# Altium footprint library CAP_TH.PcbLib: 219 footprints (part 4 of 14)
Each footprint in its own frame and in the unit in brackets; x right, y up, seen from the top. Pads: shape width x height; smd on the part's side, far side on the other; paste and mask are expansions set on the pad; w line width, h text height; cw(c..) or ccw(c..) is an arc to the next point about the centre after c.
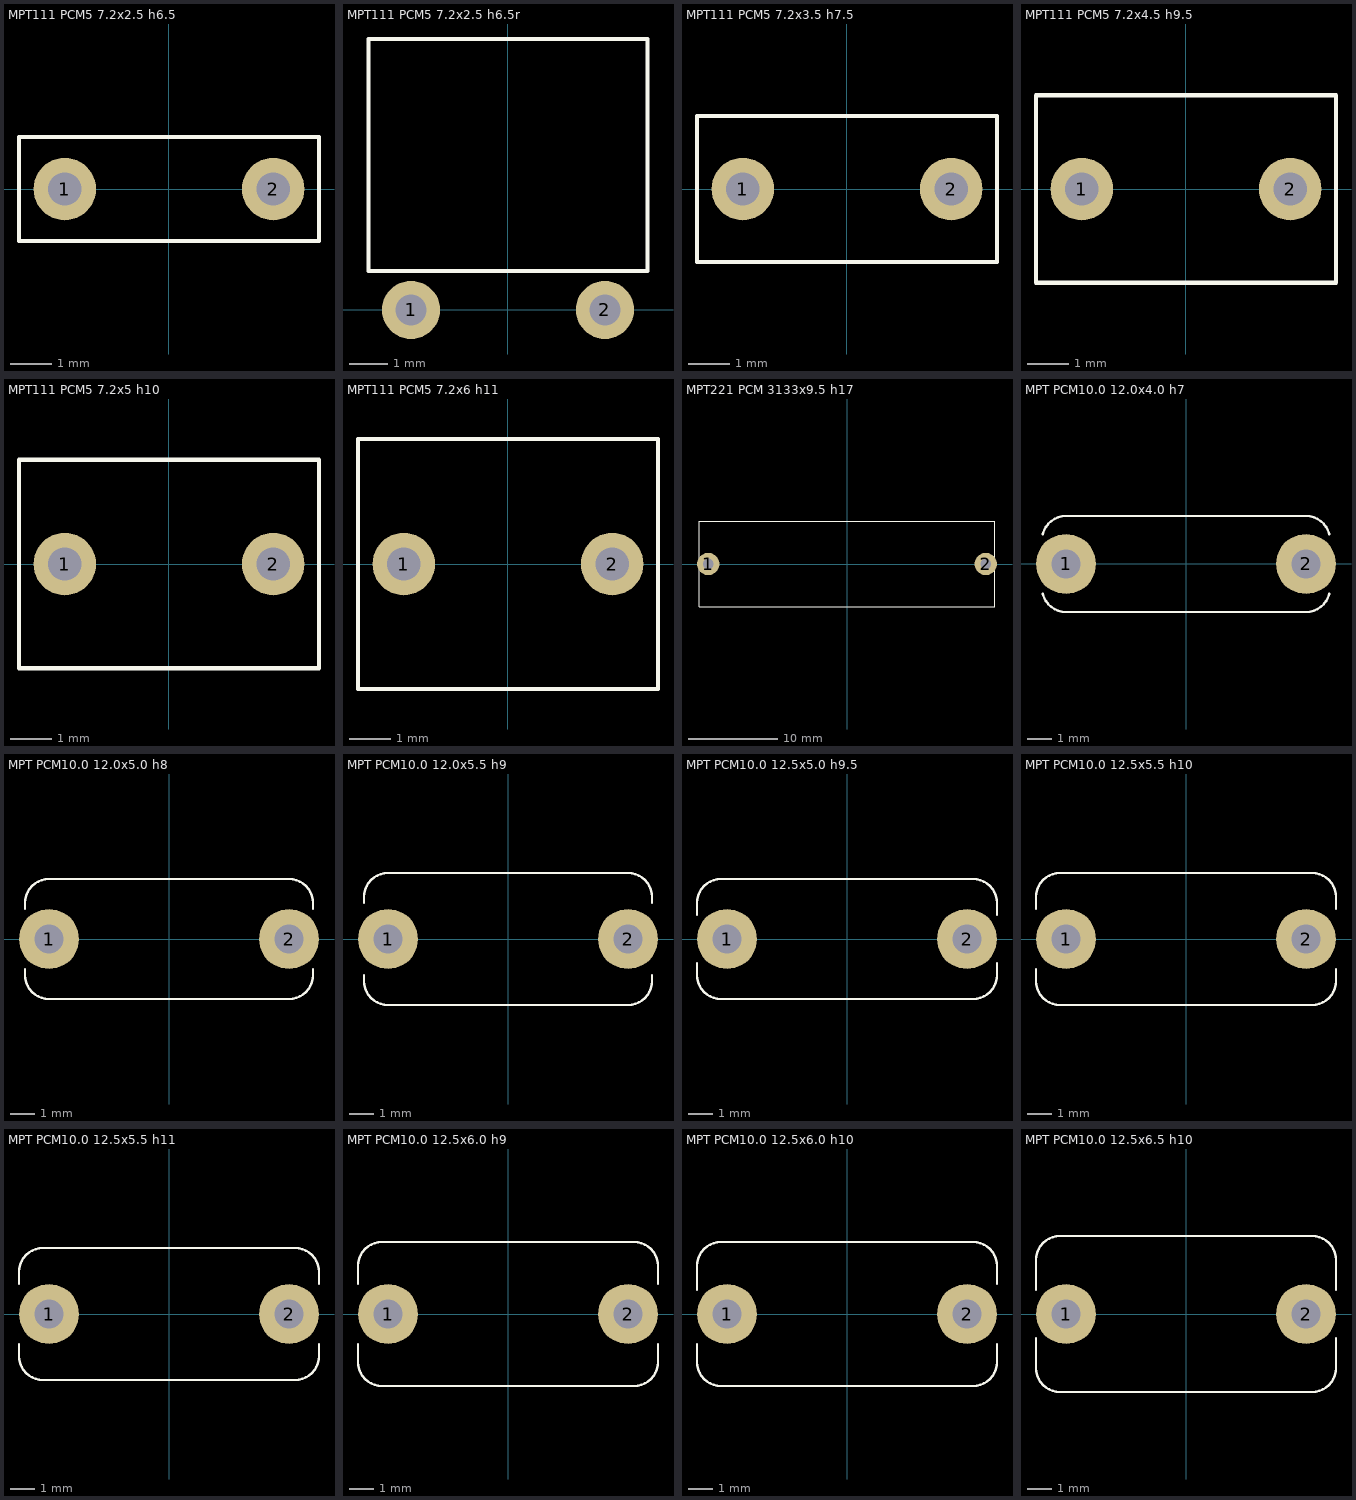
[diagram p3: the footprints below, top view; thin cyan lines are the x and y axes]

## MPT111 PCM5 7.2x2.5 h6.5 [mm]
pads (2):
  round 1.5 hole 0.8: 1(-2.5,0) 2(2.5,0)
Top Overlay:
  lines w0.1: -3.6,-1.25 -3.6,1.25 3.6,1.25 3.6,-1.25 -3.6,-1.25
3D body "MPT111 PCM5 7.2x2.5 h6.5.STEP": height 6.5, standoff -2.1, extent -3.6,-1.25 3.6,1.25

## MPT111 PCM5 7.2x2.5 h6.5r [mm]
pads (2):
  round 1.5 hole 0.8: 1(-2.5,0) 2(2.5,0)
Top Overlay:
  lines w0.1: -3.6,1 3.6,1 3.6,6.985 -3.6,6.985 -3.6,1
3D body "MPT111 PCM5 7.2x2.5 h6.5r.STEP": height 2.5, standoff -2, extent -3.6,-0.3 3.6,7

## MPT111 PCM5 7.2x3.5 h7.5 [mm]
pads (2):
  round 1.5 hole 0.8: 1(-2.5,0) 2(2.5,0)
Top Overlay:
  lines w0.1: -3.6,-1.75 3.6,-1.75 3.6,1.75 -3.6,1.75 -3.6,-1.75
3D body "MPT111 PCM5 7.2x3.5 h7.5.STEP": height 7.5, standoff -2.1, extent -3.6,-1.75 3.6,1.75

## MPT111 PCM5 7.2x4.5 h9.5 [mm]
pads (2):
  round 1.5 hole 0.8: 1(-2.5,0) 2(2.5,0)
Top Overlay:
  lines w0.1: -3.6,-2.25 -3.6,2.25 3.6,2.25 3.6,-2.25 -3.6,-2.25
3D body "MPT111 PCM5 7.2x4.5 h9.5.STEP": height 9.5, standoff -2, extent -3.6,-2.25 3.6,2.25

## MPT111 PCM5 7.2x5 h10 [mm]
pads (2):
  round 1.5 hole 0.8: 1(-2.5,0) 2(2.5,0)
Top Overlay:
  lines w0.1: -3.6,-2.5 -3.6,2.5 3.6,2.5 3.6,-2.5 -3.6,-2.5
3D body "MPT111 PCM5 7.2x5 h10.STEP": height 10, standoff -2.1, extent -3.6,-2.5 3.6,2.5

## MPT111 PCM5 7.2x6 h11 [mm]
pads (2):
  round 1.5 hole 0.8: 1(-2.5,0) 2(2.5,0)
Top Overlay:
  lines w0.1: -3.6,-3 3.6,-3 3.6,3 -3.6,3 -3.6,-3
3D body "MPT111 PCM5 7.2x6 h11.STEP": height 11, standoff -2.1, extent -3.6,-3 3.6,3

## MPT221 PCM 3133x9.5 h17 [mm]
pads (2):
  round 2.5 hole 1.2: 1(-15.5,0) 2(15.5,0)
Top Overlay:
  lines w0.1: -16.51,-4.75 16.51,-4.75 16.51,4.75 -16.51,4.75 -16.51,-4.75
3D body "MPT221 33x9.5 h17 F31.STEP": height 18, standoff -2, extent -16.5,-4.75 16.5,4.75

## MPT PCM10.0 12.0x4.0 h7 [mm]
pads (2):
  round 2.5 hole 1.2: 1(-5,0) 2(5,0)
Top Overlay:
  lines w0.1: -5.97,-1.243 ccw(c-5,-1) -5,-2 5,-2 ccw(c5,-1) 5.97,-1.243 ; -5.97,1.243 cw(c-5,1) -5,2 5,2 cw(c5,1) 5.97,1.243
3D body "MPT PCM10.0 12.0x4.0 h7.STEP": height 9, standoff -2, extent -6,-2 6,2

## MPT PCM10.0 12.0x5.0 h8 [mm]
pads (2):
  round 2.5 hole 1.2: 1(-5,0) 2(5,0)
Top Overlay:
  lines w0.1: -6,-1.25 -6,-1.5 ccw(c-5,-1.5) -5,-2.5 5,-2.5 ccw(c5,-1.5) 6,-1.5 6,-1.25 ; -6,1.25 -6,1.5 cw(c-5,1.5) -5,2.5 5,2.5 cw(c5,1.5) 6,1.5 6,1.25
3D body "MPT PCM10.0 12.0x5.0 h8.STEP": height 10, standoff -2, extent -6,-2.5 6,2.5

## MPT PCM10.0 12.0x5.5 h9 [mm]
pads (2):
  round 2.5 hole 1.2: 1(-5,0) 2(5,0)
Top Overlay:
  lines w0.1: -6,-1.5 -6,-1.75 ccw(c-5,-1.75) -5,-2.75 5,-2.75 ccw(c5,-1.75) 6,-1.75 6,-1.5 ; -6,1.5 -6,1.75 cw(c-5,1.75) -5,2.75 5,2.75 cw(c5,1.75) 6,1.75 6,1.5
3D body "MPT PCM10.0 12.0x5.5 h9.STEP": height 11, standoff -2, extent -6,-2.75 6,2.75

## MPT PCM10.0 12.5x5.0 h9.5 [mm]
pads (2):
  round 2.5 hole 1.2: 1(-5,0) 2(5,0)
Top Overlay:
  lines w0.1: -6.25,-1 -6.25,-1.5 ccw(c-5.25,-1.5) -5.25,-2.5 5.25,-2.5 ccw(c5.25,-1.5) 6.25,-1.5 6.25,-1 ; -6.25,1 -6.25,1.5 cw(c-5.25,1.5) -5.25,2.5 5.25,2.5 cw(c5.25,1.5) 6.25,1.5 6.25,1
3D body "MPT PCM10.0 12.5x5.0 h9.5.STEP": height 11.5, standoff -2, extent -6.25,-2.5 6.25,2.5

## MPT PCM10.0 12.5x5.5 h10 [mm]
pads (2):
  round 2.5 hole 1.2: 1(-5,0) 2(5,0)
Top Overlay:
  lines w0.1: -6.25,-1.25 -6.25,-1.75 ccw(c-5.25,-1.75) -5.25,-2.75 5.25,-2.75 ccw(c5.25,-1.75) 6.25,-1.75 6.25,-1.25 ; -6.25,1.25 -6.25,1.75 cw(c-5.25,1.75) -5.25,2.75 5.25,2.75 cw(c5.25,1.75) 6.25,1.75 6.25,1.25
3D body "MPT PCM10.0 12.5x5.5 h10.STEP": height 12, standoff -2, extent -6.25,-2.75 6.25,2.75

## MPT PCM10.0 12.5x5.5 h11 [mm]
pads (2):
  round 2.5 hole 1.2: 1(-5,0) 2(5,0)
Top Overlay:
  lines w0.1: -6.25,-1.25 -6.25,-1.75 ccw(c-5.25,-1.75) -5.25,-2.75 5.25,-2.75 ccw(c5.25,-1.75) 6.25,-1.75 6.25,-1.25 ; -6.25,1.25 -6.25,1.75 cw(c-5.25,1.75) -5.25,2.75 5.25,2.75 cw(c5.25,1.75) 6.25,1.75 6.25,1.25
3D body "MPT PCM10.0 12.5x5.5 h11.STEP": height 13, standoff -2, extent -6.25,-2.75 6.25,2.75

## MPT PCM10.0 12.5x6.0 h9 [mm]
pads (2):
  round 2.5 hole 1.2: 1(-5,0) 2(5,0)
Top Overlay:
  lines w0.1: -6.25,-1.25 -6.25,-2 ccw(c-5.25,-2) -5.25,-3 5.25,-3 ccw(c5.25,-2) 6.25,-2 6.25,-1.25 ; -6.25,1.25 -6.25,2 cw(c-5.25,2) -5.25,3 5.25,3 cw(c5.25,2) 6.25,2 6.25,1.25
3D body "MPT PCM10.0 12.5x6.0 h9.STEP": height 11, standoff -2, extent -6.25,-3 6.25,3

## MPT PCM10.0 12.5x6.0 h10 [mm]
pads (2):
  round 2.5 hole 1.2: 1(-5,0) 2(5,0)
Top Overlay:
  lines w0.1: -6.25,-1.25 -6.25,-2 ccw(c-5.25,-2) -5.25,-3 5.25,-3 ccw(c5.25,-2) 6.25,-2 6.25,-1.25 ; -6.25,1 -6.25,2 cw(c-5.25,2) -5.25,3 5.25,3 cw(c5.25,2) 6.25,2 6.25,1.25
3D body "MPT PCM10.0 12.5x6.0 h10.STEP": height 12, standoff -2, extent -6.25,-3 6.25,3

## MPT PCM10.0 12.5x6.5 h10 [mm]
pads (2):
  round 2.5 hole 1.2: 1(-5,0) 2(5,0)
Top Overlay:
  lines w0.1: -6.25,-1 -6.25,-2.25 ccw(c-5.25,-2.25) -5.25,-3.25 5.25,-3.25 ccw(c5.25,-2.25) 6.25,-2.25 6.25,-1 ; -6.25,1 -6.25,2.25 cw(c-5.25,2.25) -5.25,3.25 5.25,3.25 cw(c5.25,2.25) 6.25,2.25 6.25,1
3D body "MPT PCM10.0 12.5x6.5 h10.STEP": height 12, standoff -2, extent -6.25,-3.25 6.25,3.25